# Altium footprint library Basal.PcbLib: 248 footprints (part 1 of 16)
Each footprint in its own frame and in the unit in brackets; x right, y up, seen from the top. Pads: shape width x height; smd on the part's side, far side on the other; paste and mask are expansions set on the pad; w line width, h text height; cw(c..) or ccw(c..) is an arc to the next point about the centre after c.
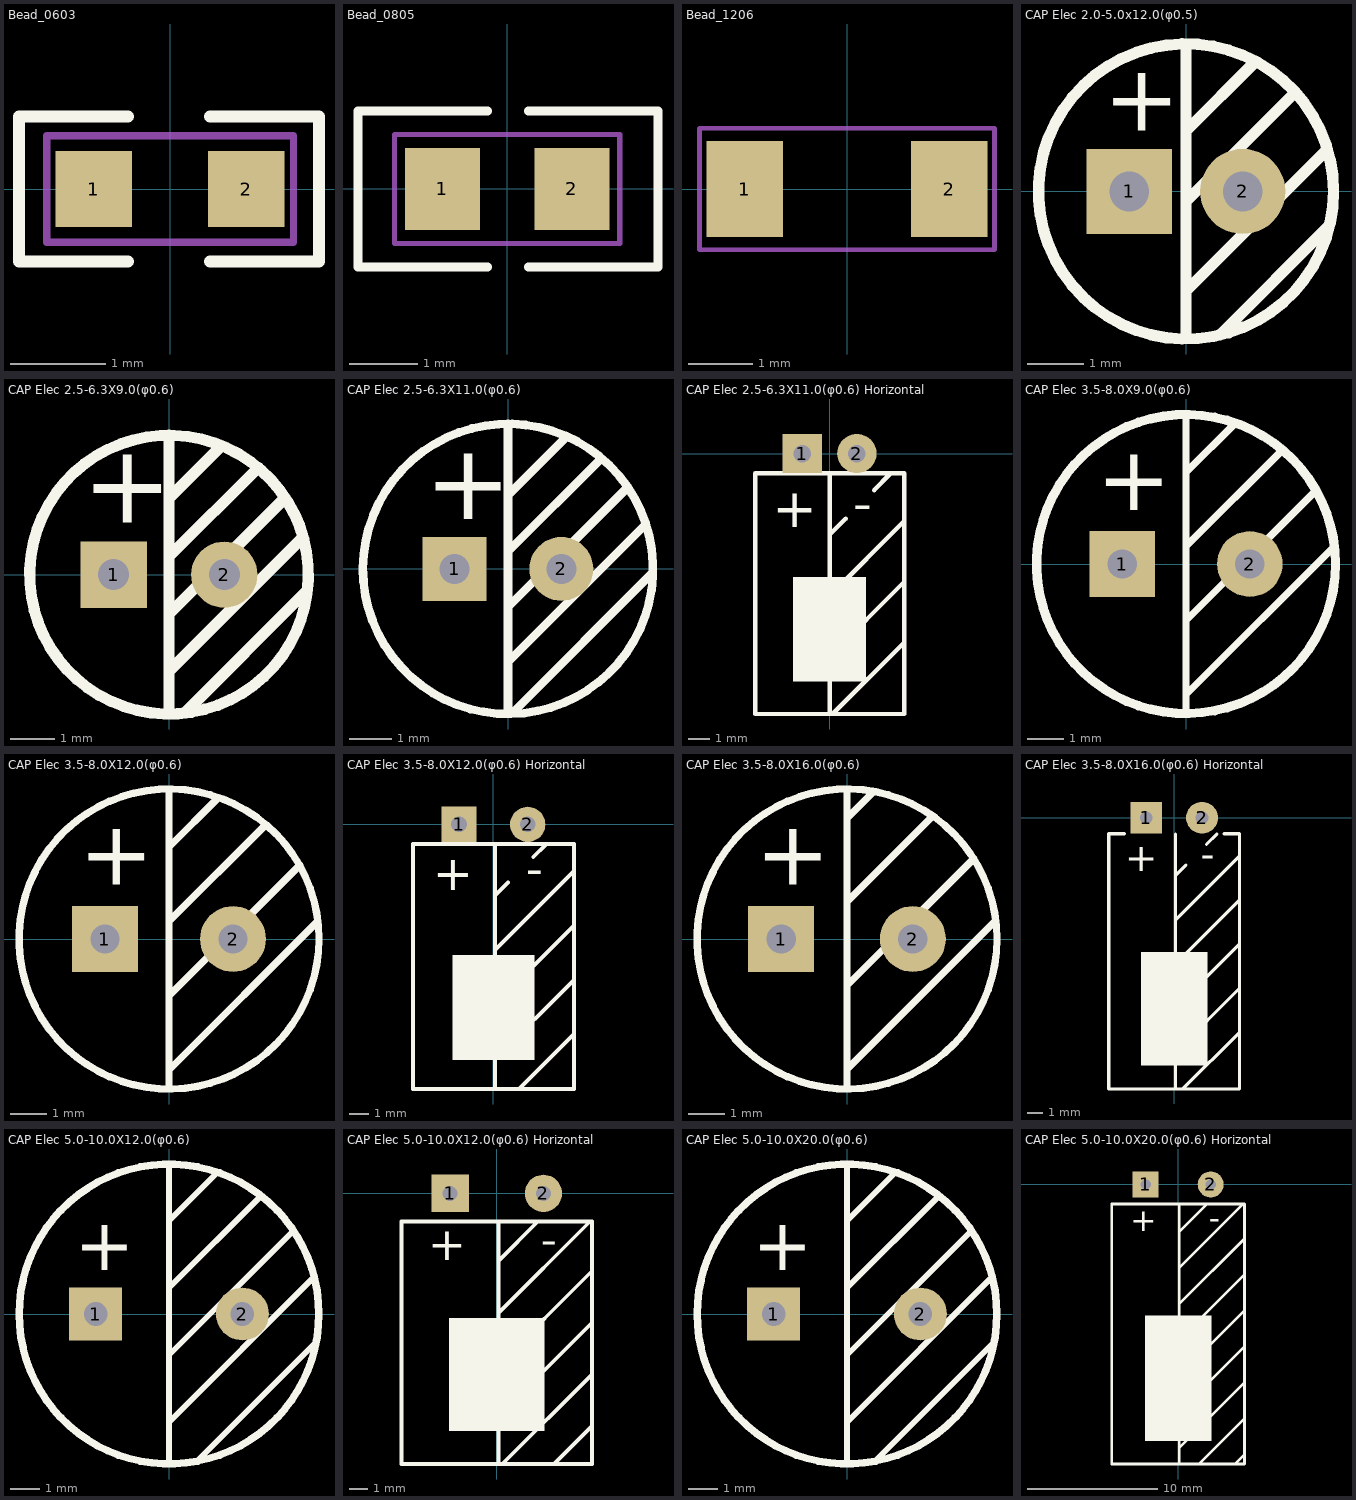
[diagram p0: the footprints below, top view; thin cyan lines are the x and y axes]

## Bead_0603 [mm] "贴片磁珠0603封装"
height 0.4
pads (2):
  rect 0.8x0.8 smd paste-1: 1(-0.8,0) 2(0.8,0)
Top Overlay:
  lines w0.127: -0.443,-0.762 -1.586,-0.762 -1.586,0.762 -0.443,0.762 ; 0.421,-0.762 1.564,-0.762 1.564,0.762 0.421,0.762
Top Paste:
  region: 0.419,0.15 0.719,0.368 1.169,0.368 1.169,-0.368 0.719,-0.368 0.419,-0.15
  region: -0.419,-0.15 -0.719,-0.368 -1.169,-0.368 -1.169,0.368 -0.719,0.368 -0.419,0.15
Mechanical 15:
  lines w0.076: -1.295,-0.559 -1.295,0.559 1.295,0.559 1.295,-0.559 -1.295,-0.559
3D body "Ferrite bead-0603.STEP": height 0.8, standoff 0, extent -0.8,-0.4 0.8,0.4

## Bead_0805 [mm] "贴片磁珠0603封装"
height 0.4
pads (2):
  rect 1.1x1.2 smd paste-2: 1(-0.95,0) 2(0.95,0)
Top Overlay:
  lines w0.127: -0.282,-1.143 -2.187,-1.143 -2.187,1.143 -0.282,1.143 ; 0.307,-1.143 2.212,-1.143 2.212,1.143 0.307,1.143
Top Paste:
  region: 0.452,0.459 0.452,0.479 0.467,0.515 0.496,0.544 0.532,0.559 0.552,0.559 1.348,0.559 1.368,0.559 1.404,0.544 1.433,0.515 1.448,0.479 1.448,0.459 1.448,-0.459 1.448,-0.479 1.433,-0.515 1.404,-0.544 1.368,-0.559 1.348,-0.559 0.552,-0.559 0.532,-0.559 0.496,-0.544 0.467,-0.515 0.452,-0.479 0.452,-0.459 0.452,-0.3 0.452,-0.28 0.467,-0.243 0.496,-0.215 0.532,-0.2 0.552,-0.2 0.648,-0.2 0.687,-0.196 0.759,-0.166 0.814,-0.111 0.844,-0.039 0.844,0.039 0.814,0.111 0.759,0.166 0.687,0.196 0.648,0.2 0.552,0.2 0.532,0.2 0.496,0.215 0.467,0.243 0.452,0.28 0.452,0.3
  region: -0.452,-0.459 -0.452,-0.479 -0.467,-0.515 -0.496,-0.544 -0.532,-0.559 -0.552,-0.559 -1.348,-0.559 -1.368,-0.559 -1.404,-0.544 -1.433,-0.515 -1.448,-0.479 -1.448,-0.459 -1.448,0.459 -1.448,0.479 -1.433,0.515 -1.404,0.544 -1.368,0.559 -1.348,0.559 -0.552,0.559 -0.532,0.559 -0.496,0.544 -0.467,0.515 -0.452,0.479 -0.452,0.459 -0.452,0.3 -0.452,0.28 -0.467,0.243 -0.496,0.215 -0.532,0.2 -0.552,0.2 -0.648,0.2 -0.687,0.196 -0.759,0.166 -0.814,0.111 -0.844,0.039 -0.844,-0.039 -0.814,-0.111 -0.759,-0.166 -0.687,-0.196 -0.648,-0.2 -0.552,-0.2 -0.532,-0.2 -0.496,-0.215 -0.467,-0.243 -0.452,-0.28 -0.452,-0.3
Mechanical 15:
  lines w0.076: -1.651,-0.8 -1.651,0.8 1.651,0.8 1.651,-0.8 -1.651,-0.8
3D body "Ferrite bead-0805.STEP": height 0.85, standoff 0, extent -1,-0.625 1,0.625

## Bead_1206 [mm] "贴片磁珠1206封装"
height 0.55
pads (2):
  rect 1.2x1.5 smd paste-3: 1(-1.6,0) 2(1.6,0)
Top Paste:
  region: 1.051,0.611 1.051,0.631 1.066,0.668 1.094,0.696 1.131,0.711 1.151,0.711 2.049,0.711 2.069,0.711 2.106,0.696 2.134,0.668 2.149,0.631 2.149,0.611 2.149,-0.611 2.149,-0.631 2.134,-0.668 2.106,-0.696 2.069,-0.711 2.049,-0.711 1.151,-0.711 1.131,-0.711 1.094,-0.696 1.066,-0.668 1.051,-0.631 1.051,-0.611 1.051,-0.35 1.051,-0.33 1.066,-0.293 1.094,-0.265 1.131,-0.25 1.151,-0.25 1.25,-0.25 1.299,-0.245 1.389,-0.208 1.458,-0.139 1.495,-0.049 1.495,0.049 1.458,0.139 1.389,0.208 1.299,0.245 1.25,0.25 1.151,0.25 1.131,0.25 1.094,0.265 1.066,0.293 1.051,0.33 1.051,0.35
  region: -1.051,-0.611 -1.051,-0.631 -1.066,-0.668 -1.094,-0.696 -1.131,-0.711 -1.151,-0.711 -2.049,-0.711 -2.069,-0.711 -2.106,-0.696 -2.134,-0.668 -2.149,-0.631 -2.149,-0.611 -2.149,0.611 -2.149,0.631 -2.134,0.668 -2.106,0.696 -2.069,0.711 -2.049,0.711 -1.151,0.711 -1.131,0.711 -1.094,0.696 -1.066,0.668 -1.051,0.631 -1.051,0.611 -1.051,0.35 -1.051,0.33 -1.066,0.293 -1.094,0.265 -1.131,0.25 -1.151,0.25 -1.25,0.25 -1.299,0.245 -1.389,0.208 -1.458,0.139 -1.495,0.049 -1.495,-0.049 -1.458,-0.139 -1.389,-0.208 -1.299,-0.245 -1.25,-0.25 -1.151,-0.25 -1.131,-0.25 -1.094,-0.265 -1.066,-0.293 -1.051,-0.33 -1.051,-0.35
Mechanical 15:
  lines w0.076: -2.311,-0.953 2.311,-0.953 2.311,0.953 -2.311,0.953 -2.311,-0.953
3D body "Ferrite bead-1206.STEP": height 1.35, standoff 0.05, extent -1.6,-0.8 1.6,0.8

## CAP Elec 2.0-5.0x12.0(φ0.5) [mm]
pads (2):
  rect 1.5x1.5 hole 0.7: 1(-1,0)
  round 1.5 hole 0.7: 2(1,0)
Top Overlay:
  circle w0.2: c0,0 r2.6
  lines w0.2: 0,-2.591 0,2.591 ; 0,-1.753 2.489,0.737 ; 0,-0.178 1.905,1.727 ; 0,1.067 1.219,2.286 ; 0.597,-2.527 2.527,-0.597
  text "+" at -1.448,0.686 h2
3D body: height 11, standoff -5, extent -2.5,-2.5 2.5,2.5

## CAP Elec 2.5-6.3X9.0(φ0.6) [mm]
pads (2):
  rect 1.5x1.5 hole 0.7: 1(-1.25,0)
  round 1.5 hole 0.7: 2(1.25,0)
Top Overlay:
  lines w0.254: -2.507,-1.907 cw(c0,0) -2.504,-1.911 ; 0,-3.15 0,3.15 ; 0,-2.184 2.997,0.813 ; 0,-0.889 2.616,1.727 ; 0,0.406 2.019,2.426 ; 0,1.702 0,1.727 1.143,2.87 ; 0.356,-3.124 3.099,-0.381
  text "+" at -1.956,0.584 h3.05
3D body "2.5-6.3 x 9.STEP": height 9.11, standoff -2.9, extent -3.15,-3.15 3.16,3.15

## CAP Elec 2.5-6.3X11.0(φ0.6) [mm]
pads (2):
  rect 1.5x1.5 hole 0.7: 1(-1.25,0)
  round 1.5 hole 0.7: 2(1.25,0)
Top Overlay:
  lines w0.2: -2.706,-2.058 cw(c0,0) -2.703,-2.063 ; 0,-3.327 0,3.4 ; 0,-2.184 3.226,1.041 ; 0,-0.889 2.794,1.905 ; 0,0.406 2.184,2.591 ; 0,1.702 0,1.727 1.372,3.099 ; 0.153,-3.327 3.391,-0.089
  text "+" at -1.956,0.584 h3.05
3D body "2.5 - 6.3 x 11.0.STEP": height 12.5, standoff -3, extent -3.4,-3.4 3.4,3.4

## CAP Elec 2.5-6.3X11.0(φ0.6) Horizontal [mm]
pads (2):
  rect 1.8x1.8 hole 0.8: 1(-1.25,0)
  round 1.8 hole 0.8: 2(1.25,0)
Top Overlay:
  region: 1.659,-10.414 1.659,-5.639 -1.659,-5.639 -1.659,-10.414
  lines w0.203: -0.002,-3.707 0.737,-2.968 ; 0,-11.887 0,-1.016 ; 0.007,-9.253 3.398,-5.862 ; 0.007,-6.484 3.398,-3.093 ; 0.147,-11.882 3.396,-8.632 ; 2.031,-1.674 2.772,-0.918 ; -3.4,-11.887 -3.4,-0.9 3.4,-0.9 3.4,-11.887 -3.4,-11.887
  text "-" at 1.944,-1.245 h3.05
  text "+" at -0.55,-1.245 h3.05
3D body: height 6.8, standoff 0, extent -3.4,-11.9 3.4,-0.9
3D body: height 4.4, standoff -2, extent 0.945,-0.292 1.555,0.292
3D body: height 4.4, standoff 3.8, extent 0.945,-2.121 1.555,0.292
3D body: height 4.4, standoff -2, extent -1.555,-0.292 -0.945,0.292
3D body: height 4.4, standoff 3.8, extent -1.555,-2.121 -0.945,0.292

## CAP Elec 3.5-8.0X9.0(φ0.6) [mm]
pads (2):
  rect 1.8x1.8 hole 0.8: 1(-1.75,0)
  round 1.8 hole 0.8: 2(1.75,0)
Top Overlay:
  circle w0.254: c0,0 r4.1
  lines w0.203: 0,-4.115 0,4.115 ; 0,-3.581 4.089,0.508 ; 0,-1.549 3.569,2.019 ; 0,0.483 2.654,3.137 ; 0,2.515 1.346,3.861
  text "+" at -2.45,0.889 h3.05
3D body "3.5 - 8.0 x 9.STEP": height 9.91, standoff -3.17, extent -4.128,-4.127 4.127,4.128

## CAP Elec 3.5-8.0X12.0(φ0.6) [mm]
pads (2):
  rect 1.8x1.8 hole 0.8: 1(-1.75,0)
  round 1.8 hole 0.8: 2(1.75,0)
Top Overlay:
  circle w0.2: c0,0 r4.1
  lines w0.203: 0,-4.089 0,4.089 ; 0,-3.581 4.064,0.483 ; 0,-1.549 3.569,2.019 ; 0,0.483 2.642,3.124 ; 0,2.515 1.346,3.861
  text "+" at -2.45,0.889 h3.05
3D body: height 12.3, standoff -3.3, extent -4,-4 4.002,4

## CAP Elec 3.5-8.0X12.0(φ0.6) Horizontal [mm]
pads (2):
  rect 1.8x1.8 hole 0.8: 1(-1.75,0)
  round 1.8 hole 0.8: 2(1.75,0)
Top Overlay:
  region: 2.085,-12.014 2.085,-6.655 -2.085,-6.655 -2.085,-12.014
  lines w0.203: 0.09,-13.487 0.09,-1.016 ; 0.09,-11.938 4.097,-7.932 ; 0.09,-9.169 4.089,-5.171 ; 0.09,-6.401 4.089,-2.402 ; 0.09,-3.632 0.09,-3.614 0.737,-2.968 ; 1.315,-13.482 4.084,-10.713 ; 2.031,-1.674 2.678,-1.027 ; -4.1,-13.487 4.1,-13.487 4.1,-1 -4.1,-1 -4.1,-13.487
  text "-" at 2.54,-1.245 h3.05
  text "+" at -1.016,-1.245 h3.05
3D body: height 4.4, standoff 3.8, extent 1.445,-2.121 2.055,0.292
3D body: height 4.4, standoff -2, extent 1.445,-0.292 2.055,0.292
3D body: height 8.2, standoff 0, extent -4.1,-13.516 4.1,-1.016
3D body: height 4.4, standoff -2, extent -2.055,-0.292 -1.445,0.292
3D body: height 4.4, standoff 3.8, extent -2.055,-2.121 -1.445,0.292

## CAP Elec 3.5-8.0X16.0(φ0.6) [mm]
pads (2):
  rect 1.8x1.8 hole 0.8: 1(-1.8,0)
  round 1.8 hole 0.8: 2(1.8,0)
Top Overlay:
  circle w0.2: c0,0 r4.1
  lines w0.2: 0,-4.089 0,4.089 ; 0,-3.556 4.064,0.508 ; 0,-1.27 3.467,2.197 ; 0,1.016 2.337,3.353 ; 0,3.302 0.711,4.013 0.711,4.039
  text "+" at -2.5,0.889 h3.05
3D body: height 16, standoff -3.3, extent -4,-4 4.002,4

## CAP Elec 3.5-8.0X16.0(φ0.6) Horizontal [mm]
pads (2):
  rect 2x2 hole 0.8: 1(-1.75,0)
  round 2 hole 0.8: 2(1.75,0)
Top Overlay:
  region: 2.085,-15.545 2.085,-8.407 -2.085,-8.407 -2.085,-15.545
  lines w0.203: -3.124,-1 -4.1,-1 -4.1,-17.018 4.1,-17.018 4.1,-1 3.124,-1 ; 0.09,-17.018 0.09,-1.016 ; 0.09,-11.938 4.097,-7.932 ; 0.09,-9.169 4.089,-5.171 ; 0.09,-6.401 4.089,-2.402 ; 0.09,-3.632 0.09,-3.614 0.737,-2.968 ; 0.096,-14.701 4.084,-10.713 ; 0.553,-17.012 4.089,-13.477 ; 2.031,-1.674 2.678,-1.027
  text "-" at 2.54,-1.245 h3.05
  text "+" at -1.016,-1.245 h3.05
3D body: height 4.4, standoff 3.8, extent 1.445,-2.121 2.055,0.292
3D body: height 4.4, standoff -2, extent 1.445,-0.292 2.055,0.292
3D body: height 8.2, standoff 0, extent -4.111,-17.016 4.089,-1.016
3D body: height 4.4, standoff -2, extent -2.055,-0.292 -1.445,0.292
3D body: height 4.4, standoff 3.8, extent -2.055,-2.121 -1.445,0.292

## CAP Elec 5.0-10.0X12.0(φ0.6) [mm]
pads (2):
  rect 1.8x1.8 hole 0.8: 1(-2.5,0)
  round 1.8 hole 0.8: 2(2.5,0)
Top Overlay:
  circle w0.254: c0,0 r5.1
  lines w0.2: 0,-5.105 0,5.105 ; 0,-3.683 4.966,1.283 ; 0,-1.397 4.242,2.845 ; 0,0.889 3.137,4.026 ; 0,3.175 1.6,4.775 ; 0.965,-5.004 5.016,-0.953
  text "+" at -3.2,0.889 h3.05
3D body "10X12.STEP": height 12, standoff -2.5, extent -5,-5 5,5

## CAP Elec 5.0-10.0X12.0(φ0.6) Horizontal [mm]
pads (2):
  rect 2x2 hole 0.8: 1(-2.5,0)
  round 2 hole 0.8: 2(2.5,0)
Top Overlay:
  region: 2.555,-12.74 2.555,-6.68 -2.555,-6.68 -2.555,-12.74
  lines w0.203: 0.09,-14.5 0.09,-1.507 ; 0.09,-11.938 5.097,-6.931 ; 0.09,-9.169 5.084,-4.175 ; 0.09,-6.401 4.976,-1.516 ; 0.09,-3.632 0.09,-3.614 2.198,-1.507 ; 0.314,-14.483 5.1,-9.697 ; 3.068,-14.498 5.097,-12.468 ; -5.1,-14.5 -5.1,-1.507 5.1,-1.507 5.1,-14.5 -5.1,-14.5
  text "-" at 3.251,-1.473 h3.05
  text "+" at -1.649,-1.473 h3.05
3D body: height 4.4, standoff -2, extent 2.235,-0.495 2.845,0.089
3D body: height 4.4, standoff 3.8, extent 2.235,-2.324 2.845,0.089
3D body: height 4.4, standoff -2, extent -2.743,-0.47 -2.134,0.114
3D body: height 4.4, standoff 3.8, extent -2.743,-2.299 -2.134,0.114
3D body: height 10.2, standoff 0, extent -4.998,-14.498 5.202,-1.498

## CAP Elec 5.0-10.0X20.0(φ0.6) [mm]
pads (2):
  rect 1.8x1.8 hole 0.8: 1(-2.5,0)
  round 1.8 hole 0.8: 2(2.5,0)
Top Overlay:
  circle w0.254: c0,0 r5.1
  lines w0.2: 0,-5.105 0,5.105 ; 0,-3.683 4.966,1.283 ; 0,-1.397 4.242,2.845 ; 0,0.889 3.137,4.026 ; 0,3.175 1.6,4.775 ; 0.965,-5.004 5.016,-0.953
  text "+" at -3.2,0.889 h3.05
3D body "5.0 - 10.0 x 20.0.STEP": height 20.32, standoff -2.9, extent -5.08,-5.08 5.08,5.08

## CAP Elec 5.0-10.0X20.0(φ0.6) Horizontal [mm]
pads (2):
  rect 2x2 hole 0.8: 1(-2.5,0)
  round 2 hole 0.8: 2(2.5,0)
Top Overlay:
  region: 2.555,-19.74 2.555,-10.088 -2.555,-10.088 -2.555,-19.74
  lines w0.203: 0.09,-21.5 0.09,-1.507 ; 0.09,-20.244 5.087,-15.247 ; 0.09,-17.475 5.097,-12.468 ; 0.09,-14.707 5.1,-9.697 ; 0.09,-11.938 5.097,-6.931 ; 0.09,-9.169 5.084,-4.175 ; 0.09,-6.401 4.976,-1.516 ; 0.09,-3.632 0.09,-3.614 2.198,-1.507 ; 1.607,-21.496 5.087,-18.016 ; 4.37,-21.501 5.087,-20.784 ; 5.1,-21.5 -5.1,-21.5 -5.1,-1.507 5.1,-1.507 5.1,-21.488
  text "-" at 3.251,-1.473 h3.05
  text "+" at -1.649,-1.473 h3.05
3D body: height 4.4, standoff 3.8, extent -2.783,-2.096 -2.173,0.318
3D body: height 4.4, standoff -2, extent -2.783,-0.267 -2.173,0.318
3D body: height 4.4, standoff 3.8, extent 2.195,-2.121 2.805,0.292
3D body: height 4.4, standoff -2, extent 2.195,-0.292 2.805,0.292
3D body: height 10.2, standoff 0, extent -4.998,-21.498 5.202,-1.498